# Altium integrated library Connectors.IntLib: 512 symbols (part 1 of 2) (continued)
## KE 04 1 1 x 1 xxxx G (continued)

## KE 06 1 1 x 1 xxxx G
designator X?  (value not drawn)
3.5 mm 300V/8A; Manufacturer PartNumber: jx-017; Value: WJ15EDGRHBN-THT-3.5; Note: Connector; Temp.Characteristic: -40C to +85C; Package / Case: 3.5 mm; PartNumber Digi-Key: jx-017; Publisher: Catcatcat Electronics; Voltage: 300V/8A; Manufacturer: http://en.china-wj.com/index.html; Website developer: http://catcatcat.d-lan.dp.ua/; Assembly type: Manual Part
footprint KE 06 1 1 x 1 xxxx G
pins: 1, 2, 3, 4, 5, 6

## KE 08 1 1 x 1 xxxx G
designator X?  (value not drawn)
3.5 mm 300V/8A; Manufacturer PartNumber: jx-017; Value: WJ15EDGRHBN-THT-3.5; Note: Connector; Temp.Characteristic: -40C to +85C; Package / Case: 3.5 mm; PartNumber Digi-Key: jx-017; Publisher: Catcatcat Electronics; Voltage: 300V/8A; Manufacturer: http://en.china-wj.com/index.html; Website developer: http://catcatcat.d-lan.dp.ua/; Assembly type: Manual Part
footprint KE 08 1 1 x 1 xxxx G
pins: 1, 2, 3, 4, 5, 6, 7, 8

## KE 10 1 1 x 1 xxxx G
designator X?  (value not drawn)
3.5 mm 300V/8A; Manufacturer PartNumber: jx-017; Value: WJ15EDGRHBN-THT-3.5; Note: Connector; Temp.Characteristic: -40C to +85C; Package / Case: 3.5 mm; PartNumber Digi-Key: jx-017; Publisher: Catcatcat Electronics; Voltage: 300V/8A; Manufacturer: http://en.china-wj.com/index.html; Website developer: http://catcatcat.d-lan.dp.ua/; Assembly type: Manual Part
footprint KE 10 1 1 x 1 xxxx G
pins: 1, 2, 3, 4, 5, 6, 7, 8, 9, 10

## KE 12 1 1 x 1 xxxx G
designator X?  (value not drawn)
3.5 mm 300V/8A; Manufacturer PartNumber: jx-017; Value: WJ15EDGRHBN-THT-3.5; Note: Connector; Temp.Characteristic: -40C to +85C; Package / Case: 3.5 mm; PartNumber Digi-Key: jx-017; Publisher: Catcatcat Electronics; Voltage: 300V/8A; Manufacturer: http://en.china-wj.com/index.html; Website developer: http://catcatcat.d-lan.dp.ua/; Assembly type: Manual Part
footprint KE 12 1 1 x 1 xxxx G
pins: 1, 2, 3, 4, 5, 6, 7, 8, 9, 10, 11, 12

## KE 14 1 1 x 1 xxxx G
designator X?  (value not drawn)
3.5 mm 300V/8A; Manufacturer PartNumber: jx-017; Value: WJ15EDGRHBN-THT-3.5; Note: Connector; Temp.Characteristic: -40C to +85C; Package / Case: 3.5 mm; PartNumber Digi-Key: jx-017; Publisher: Catcatcat Electronics; Voltage: 300V/8A; Manufacturer: http://en.china-wj.com/index.html; Website developer: http://catcatcat.d-lan.dp.ua/; Assembly type: Manual Part
footprint KE 14 1 1 x 1 xxxx G
pins: 1, 2, 3, 4, 5, 6, 7, 8, 9, 10, 11, 12, 13, 14

## KE 16 1 1 x 1 xxxx G
designator X?  (value not drawn)
3.5 mm 300V/8A; Manufacturer PartNumber: jx-017; Value: WJ15EDGRHBN-THT-3.5; Note: Connector; Temp.Characteristic: -40C to +85C; Package / Case: 3.5 mm; PartNumber Digi-Key: jx-017; Publisher: Catcatcat Electronics; Voltage: 300V/8A; Manufacturer: http://en.china-wj.com/index.html; Website developer: http://catcatcat.d-lan.dp.ua/; Assembly type: Manual Part
footprint KE 16 1 1 x 1 xxxx G
pins: 1, 2, 3, 4, 5, 6, 7, 8, 9, 10, 11, 12, 13, 14, 15, 16

## KE 18 1 1 x 1 xxxx G
designator X?  (value not drawn)
3.5 mm 300V/8A; Manufacturer PartNumber: jx-017; Value: WJ15EDGRHBN-THT-3.5; Note: Connector; Temp.Characteristic: -40C to +85C; Package / Case: 3.5 mm; PartNumber Digi-Key: jx-017; Publisher: Catcatcat Electronics; Voltage: 300V/8A; Manufacturer: http://en.china-wj.com/index.html; Website developer: http://catcatcat.d-lan.dp.ua/; Assembly type: Manual Part
footprint KE 18 1 1 x 1 xxxx G
pins: 1, 2, 3, 4, 5, 6, 7, 8, 9, 10, 11, 12, 13, 14, 15, 16, 17, 18

## KE 20 1 1 x 1 xxxx G
designator X?  (value not drawn)
3.5 mm 300V/8A; Manufacturer PartNumber: jx-017; Value: WJ15EDGRHBN-THT-3.5; Note: Connector; Temp.Characteristic: -40C to +85C; Package / Case: 3.5 mm; PartNumber Digi-Key: jx-017; Publisher: Catcatcat Electronics; Voltage: 300V/8A; Manufacturer: http://en.china-wj.com/index.html; Website developer: http://catcatcat.d-lan.dp.ua/; Assembly type: Manual Part
footprint KE 20 1 1 x 1 xxxx G
pins: 1, 2, 3, 4, 5, 6, 7, 8, 9, 10, 11, 12, 13, 14, 15, 16, 17, 18, 19, 20

## KE 22 1 1 x 1 xxxx G
designator X?  (value not drawn)
3.5 mm 300V/8A; Manufacturer PartNumber: jx-017; Value: WJ15EDGRHBN-THT-3.5; Note: Connector; Temp.Characteristic: -40C to +85C; Package / Case: 3.5 mm; PartNumber Digi-Key: jx-017; Publisher: Catcatcat Electronics; Voltage: 300V/8A; Manufacturer: http://en.china-wj.com/index.html; Website developer: http://catcatcat.d-lan.dp.ua/; Assembly type: Manual Part
footprint KE 22 1 1 x 1 xxxx G
pins: 1, 2, 3, 4, 5, 6, 7, 8, 9, 10, 11, 12, 13, 14, 15, 16, 17, 18, 19, 20, 21, 22

## KE 24 1 1 x 1 xxxx G
designator X?  (value not drawn)
3.5 mm 300V/8A; Manufacturer PartNumber: jx-017; Value: WJ15EDGRHBN-THT-3.5; Note: Connector; Temp.Characteristic: -40C to +85C; Package / Case: 3.5 mm; PartNumber Digi-Key: jx-017; Publisher: Catcatcat Electronics; Voltage: 300V/8A; Manufacturer: http://en.china-wj.com/index.html; Website developer: http://catcatcat.d-lan.dp.ua/; Assembly type: Manual Part
footprint KE 24 1 1 x 1 xxxx G
pins: 1, 2, 3, 4, 5, 6, 7, 8, 9, 10, 11, 12, 13, 14, 15, 16, 17, 18, 19, 20, 21, 22, 23, 24

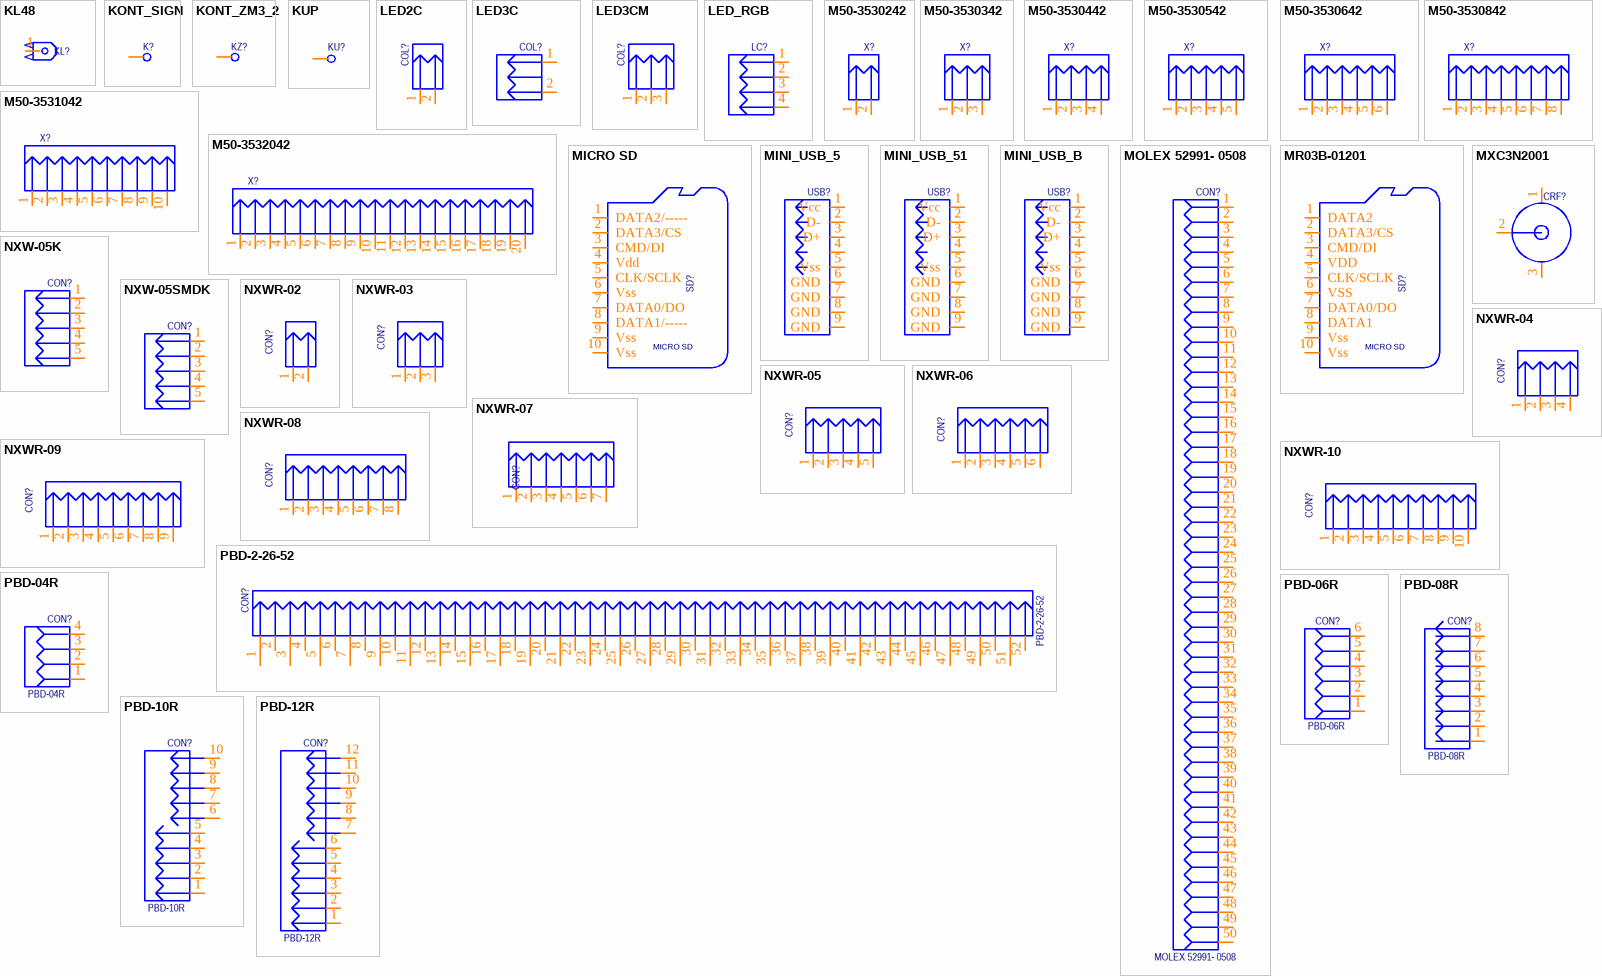
[diagram p4: symbols KL48 to PBD-12R]

## KL48
designator KL?  (value not drawn)
Note: Connector; Temp.Characteristic: -40C to +85C; Value: *; Publisher: Catcatcat Electronics; Website developer: http://catcatcat.d-lan.dp.ua/; Assembly type: Manual Part
footprint KL48
pins: 1, 2 hidden

## KONT_SIGN
designator K?  (value not drawn)
Note: Connector; Temp.Characteristic: -40C to +85C; Value: *; Publisher: Catcatcat Electronics; Website developer: http://catcatcat.d-lan.dp.ua/; Assembly type: Manual Part
footprint KONT_SIGN
pins: 1

## KONT_ZM3_2
designator KZ?  (value not drawn)
Note: Connector; Temp.Characteristic: -40C to +85C; Value: *; Publisher: Catcatcat Electronics; Website developer: http://catcatcat.d-lan.dp.ua/; Assembly type: Manual Part
footprint KONT_ZM3_2
pins: 1 0

## KUP
designator KU?  (value not drawn)
Note: Connector; Temp.Characteristic: -40C to +85C; Value: *; Publisher: Catcatcat Electronics; Website developer: http://catcatcat.d-lan.dp.ua/; Assembly type: Manual Part
footprint KUP
pins: 0

## LED2C
designator COL?  (value not drawn)
Note: Connector; Temp.Characteristic: -40C to +85C; Value: *; Publisher: Catcatcat Electronics; Website developer: http://catcatcat.d-lan.dp.ua/; Assembly type: Manual Part
footprint LED2C
pins: 1, 2

## LED3C
designator COL?  (value not drawn)
Note: Connector; Temp.Characteristic: -40C to +85C; Value: *; Publisher: Catcatcat Electronics; Website developer: http://catcatcat.d-lan.dp.ua/; Assembly type: Manual Part
footprint LED3C
pins: 1, 2, 3 hidden

## LED3CM
designator COL?  (value not drawn)
Note: Connector; Temp.Characteristic: -40C to +85C; Value: *; Publisher: Catcatcat Electronics; Website developer: http://catcatcat.d-lan.dp.ua/; Assembly type: Manual Part
footprint LED3CM
pins: 1, 2, 3

## LED_RGB
designator LC?  (value not drawn)
Note: Connector; Temp.Characteristic: -40C to +85C; Value: *; Publisher: Catcatcat Electronics; Website developer: http://catcatcat.d-lan.dp.ua/; Assembly type: Manual Part
footprint LED_RGB
pins: 1, 2, 3, 4

## M50-3530242
designator X?  (value not drawn)
CONN HDR 1.27MM T/H AU 2POS; Manufacturer: Harwin Inc.; Manufacturer PartNumber: M50-3530242; Note: Connector; Temp.Characteristic: -40C to +85C; Package / Case: 1.27mm; PartNumber Digi-Key: M50-3530242; Publisher: Catcatcat Electronics; HelpURL: https://cdn.harwin.com/pdfs/M50-353.pdf; Website developer: http://catcatcat.d-lan.dp.ua/; Assembly type: Manual Part
footprint M50-3530242 (1.27 mm)
pins: 1, 2

## M50-3530342
designator X?  (value not drawn)
CONN HDR 1.27MM T/H AU 3POS; Manufacturer: Harwin Inc.; Manufacturer PartNumber: M50-3530342; Note: Connector; Temp.Characteristic: -40C to +85C; Package / Case: 1.27mm; PartNumber Digi-Key: M50-3530342; Publisher: Catcatcat Electronics; HelpURL: https://cdn.harwin.com/pdfs/M50-353.pdf; Website developer: http://catcatcat.d-lan.dp.ua/; Assembly type: Manual Part
footprint M50-3530342 (1.27 mm)
pins: 1, 2, 3

## M50-3530442
designator X?  (value not drawn)
CONN HDR 1.27MM T/H AU 4POS; Manufacturer: Harwin Inc.; Manufacturer PartNumber: M50-3530442; Note: Connector; Temp.Characteristic: -40C to +85C; Package / Case: 1.27mm; PartNumber Digi-Key: M50-3530442; Publisher: Catcatcat Electronics; HelpURL: https://cdn.harwin.com/pdfs/M50-353.pdf; Website developer: http://catcatcat.d-lan.dp.ua/; Assembly type: Manual Part
footprint M50-3530442 (1.27 mm)
pins: 1, 2, 3, 4

## M50-3530542
designator X?  (value not drawn)
CONN HDR 1.27MM T/H AU 5POS; Manufacturer: Harwin Inc.; Manufacturer PartNumber: M50-3530542; Note: Connector; Temp.Characteristic: -40C to +85C; Package / Case: 1.27mm; PartNumber Digi-Key: M50-3530542; Publisher: Catcatcat Electronics; HelpURL: https://cdn.harwin.com/pdfs/M50-353.pdf; Website developer: http://catcatcat.d-lan.dp.ua/; Assembly type: Manual Part
footprint M50-3530542 (1.27 mm)
pins: 1, 2, 3, 4, 5

## M50-3530642
designator X?  (value not drawn)
CONN HDR 1.27MM T/H AU 6POS; Manufacturer: Harwin Inc.; Manufacturer PartNumber: M50-3530642; Note: Connector; Temp.Characteristic: -40C to +85C; Package / Case: 1.27mm; PartNumber Digi-Key: M50-3530642; Publisher: Catcatcat Electronics; HelpURL: https://cdn.harwin.com/pdfs/M50-353.pdf; Website developer: http://catcatcat.d-lan.dp.ua/; Assembly type: Manual Part
footprint M50-3530642 (1.27 mm)
pins: 1, 2, 3, 4, 5, 6

## M50-3530842
designator X?  (value not drawn)
CONN HDR 1.27MM T/H AU 8POS; Manufacturer: Harwin Inc.; Manufacturer PartNumber: M50-3530842; Note: Connector; Temp.Characteristic: -40C to +85C; Package / Case: 1.27mm; PartNumber Digi-Key: M50-3530842; Publisher: Catcatcat Electronics; HelpURL: https://cdn.harwin.com/pdfs/M50-353.pdf; Website developer: http://catcatcat.d-lan.dp.ua/; Assembly type: Manual Part
footprint M50-3530842 (1.27 mm)
pins: 1, 2, 3, 4, 5, 6, 7, 8

## M50-3531042
designator X?  (value not drawn)
CONN HDR 1.27MM T/H AU 10POS; Manufacturer: Harwin Inc.; Manufacturer PartNumber: M50-3531042; Note: Connector; Temp.Characteristic: -40C to +85C; Package / Case: 1.27mm; PartNumber Digi-Key: M50-3531042; Publisher: Catcatcat Electronics; HelpURL: https://cdn.harwin.com/pdfs/M50-353.pdf; Website developer: http://catcatcat.d-lan.dp.ua/; Assembly type: Manual Part
footprint M50-3531042 (1.27 mm)
pins: 1, 2, 3, 4, 5, 6, 7, 8, 9, 10

## M50-3532042
designator X?  (value not drawn)
CONN HDR 1.27MM T/H AU 10POS; Manufacturer: Harwin Inc.; Manufacturer PartNumber: M50-3532042; Note: Connector; Temp.Characteristic: -40C to +85C; Package / Case: 1.27mm; PartNumber Digi-Key: M50-3532042; Publisher: Catcatcat Electronics; HelpURL: https://cdn.harwin.com/pdfs/M50-353.pdf; Website developer: http://catcatcat.d-lan.dp.ua/; Assembly type: Manual Part
footprint M50-3532042 (1.27 mm)
pins: 1, 2, 3, 4, 5, 6, 7, 8, 9, 10, 11, 12, 13, 14, 15, 16, 17, 18, 19, 20

## MICRO SD
designator SD?  (value not drawn)
Micro SD; Note: Connector; Temp.Characteristic: -40C to +85C; Value: *; Publisher: Catcatcat Electronics; Website developer: http://catcatcat.d-lan.dp.ua/; Assembly type: Manual Part
footprint 5190008-010-R
pins: 1 DATA2/-----, 2 DATA3/CS, 3 CMD/DI, 4 Vdd, 5 CLK/SCLK, 6 Vss, 7 DATA0/DO, 8 DATA1/-----, 9 Vss, 10 Vss

## MINI_USB_5
designator USB?  (value not drawn)
Note: Connector; Temp.Characteristic: -40C to +85C; Value: *; Publisher: Catcatcat Electronics; Website developer: http://catcatcat.d-lan.dp.ua/; Assembly type: Manual Part
footprint MINI_USB_5
pins: 1 Vcc, 2 D-, 3 D+, 4, 5 Vss, 6 GND, 7 GND, 8 GND, 9 GND, 10 hidden, 11 hidden

## MINI_USB_51
designator USB?  (value not drawn)
Note: Connector; Temp.Characteristic: -40C to +85C; Value: *; Publisher: Catcatcat Electronics; Website developer: http://catcatcat.d-lan.dp.ua/; Assembly type: Manual Part
footprint MINI_USB_51
pins: 1 Vcc, 2 D-, 3 D+, 4, 5 Vss, 6 GND, 7 GND, 8 GND, 9 GND, 10 hidden, 11 hidden

## MINI_USB_B
designator USB?  (value not drawn)
Note: Connector; Temp.Characteristic: -40C to +85C; Value: *; Publisher: Catcatcat Electronics; Website developer: http://catcatcat.d-lan.dp.ua/; Assembly type: Manual Part
footprint MINI_USB_B
pins: 1 Vcc, 2 D-, 3 D+, 4, 5 Vss, 6 GND, 7 GND, 8 GND, 9 GND

## MOLEX 52991- 0508
designator CON?
Note: Connector; Temp.Characteristic: -40C to +85C; Value: *; Publisher: Catcatcat Electronics; Website developer: http://catcatcat.d-lan.dp.ua/; Assembly type: Manual Part
footprint MOLEX 52991- 0508
pins: 1, 2, 3, 4, 5, 6, 7, 8, 9, 10, 11, 12, 13, 14, 15, 16, 17, 18, 19, 20, 21, 22, 23, 24, 25, 26, 27, 28, 29, 30, 31, 32, 33, 34, 35, 36, 37, 38, 39, 40, 41, 42, 43, 44, 45, 46, 47, 48, 49, 50

## MR03B-01201
designator SD?  (value not drawn)
Micro SD; Note: Connector; Temp.Characteristic: -40C to +85C; Value: *; Publisher: Catcatcat Electronics; Website developer: http://catcatcat.d-lan.dp.ua/; Assembly type: Manual Part
footprint 5190008-010-R
pins: 1 DATA2, 2 DATA3/CS, 3 CMD/DI, 4 VDD, 5 CLK/SCLK, 6 VSS, 7 DATA0/DO, 8 DATA1, 9 Vss, 10 Vss
text: MICRO SD

## MXC3N2001
designator CRF?  (value not drawn)
Note: Connector; Temp.Characteristic: -40C to +85C; Publisher: Catcatcat Electronics; Website developer: http://catcatcat.d-lan.dp.ua/; Assembly type: Manual Part
footprint MXC3N2001
pins: 1 GND, 2 RF, 3 GND

## NXW-05K
designator CON?  (value not drawn)
Note: Connector; Temp.Characteristic: -40C to +85C; Value: *; Publisher: Catcatcat Electronics; Website developer: http://catcatcat.d-lan.dp.ua/; Assembly type: Manual Part
footprint NXW-05K
pins: 1, 2, 3, 4, 5

## NXW-05SMDK
designator CON?  (value not drawn)
Note: Connector; Temp.Characteristic: -40C to +85C; Value: *; Publisher: Catcatcat Electronics; Website developer: http://catcatcat.d-lan.dp.ua/; Assembly type: Manual Part
footprint NXW-05SMDK
pins: 1, 2, 3, 4, 5, 6 hidden, 7 hidden

## NXWR-02
designator CON?  (value not drawn)
PH-2AW; Note: Connector; Temp.Characteristic: -40C to +85C; Value: *; Publisher: Catcatcat Electronics; Website developer: http://catcatcat.d-lan.dp.ua/; Assembly type: Manual Part
footprint NXWR-02
pins: 1, 2

## NXWR-03
designator CON?  (value not drawn)
Note: Connector; Temp.Characteristic: -40C to +85C; Value: *; Publisher: Catcatcat Electronics; Website developer: http://catcatcat.d-lan.dp.ua/; Assembly type: Manual Part
footprint NXWR-03
pins: 1, 2, 3

## NXWR-04
designator CON?  (value not drawn)
Note: Connector; Temp.Characteristic: -40C to +85C; Value: *; Publisher: Catcatcat Electronics; Website developer: http://catcatcat.d-lan.dp.ua/; Assembly type: Manual Part
footprint NXWR-04
pins: 1, 2, 3, 4

## NXWR-05
designator CON?  (value not drawn)
Note: Connector; Temp.Characteristic: -40C to +85C; Value: *; Publisher: Catcatcat Electronics; Website developer: http://catcatcat.d-lan.dp.ua/; Assembly type: Manual Part
footprint NXWR-05
pins: 1, 2, 3, 4, 5

## NXWR-06
designator CON?  (value not drawn)
PH-6AW; Pricing Аlternative: 0.010; Note: Connector; Temp.Characteristic: -25C to +85C; Voltage: 100 V; Value: PH-6AW; ComponentLink1URL: http://www.jst-mfg.com/product/detail_e.php?series=199; ComponentLink2URL: http://www.jst-mfg.com/product/pdf/eng/ePH.pdf; Dealer Digi-Key: https://detail.1688.com/offer/550077379511.html; Dealer Аlternative: https://voron.ua/catalog/028519; Package / Case: NXWR-06; PartNumber Digi-Key: NXWR-06; Pricing Digi-Key: 0.0163; Publisher: Catcatcat Electronics; Website developer: http://catcatcat.d-lan.dp.ua/; Assembly type: Manual Part
footprint NXWR-06
pins: 1, 2, 3, 4, 5, 6

## NXWR-07
designator CON?  (value not drawn)
Note: Connector; Temp.Characteristic: -40C to +85C; Value: *; Publisher: Catcatcat Electronics; Website developer: http://catcatcat.d-lan.dp.ua/; Assembly type: Manual Part
footprint NXWR-07
pins: 1, 2, 3, 4, 5, 6, 7

## NXWR-08
designator CON?  (value not drawn)
Note: Connector; Temp.Characteristic: -40C to +85C; Value: *; Publisher: Catcatcat Electronics; Website developer: http://catcatcat.d-lan.dp.ua/; Assembly type: Manual Part
footprint NXWR-08
pins: 1, 2, 3, 4, 5, 6, 7, 8

## NXWR-09
designator CON?  (value not drawn)
Note: Connector; Temp.Characteristic: -40C to +85C; Value: *; Publisher: Catcatcat Electronics; Website developer: http://catcatcat.d-lan.dp.ua/; Assembly type: Manual Part
footprint NXWR-09
pins: 1, 2, 3, 4, 5, 6, 7, 8, 9

## NXWR-10
designator CON?  (value not drawn)
Note: Connector; Temp.Characteristic: -40C to +85C; Value: *; Publisher: Catcatcat Electronics; Website developer: http://catcatcat.d-lan.dp.ua/; Assembly type: Manual Part
footprint NXWR-10
pins: 1, 2, 3, 4, 5, 6, 7, 8, 9, 10

## PBD-2-26-52
designator CON?
Note: Connector; Temp.Characteristic: -40C to +85C; Value: *; Publisher: Catcatcat Electronics; Website developer: http://catcatcat.d-lan.dp.ua/; Assembly type: Manual Part
footprint PBD-2-26-52
pins: 1, 2, 3, 4, 5, 6, 7, 8, 9, 10, 11, 12, 13, 14, 15, 16, 17, 18, 19, 20, 21, 22, 23, 24, 25, 26, 27, 28, 29, 30, 31, 32, 33, 34, 35, 36, 37, 38, 39, 40, 41, 42, 43, 44, 45, 46, 47, 48, 49, 50, 51, 52

## PBD-04R
designator CON?
Note: Connector; Temp.Characteristic: -40C to +85C; Value: *; Publisher: Catcatcat Electronics; Website developer: http://catcatcat.d-lan.dp.ua/; Assembly type: Manual Part
footprint PBD-04R
pins: 1, 2, 3, 4

## PBD-06R
designator CON?
Note: Connector; Temp.Characteristic: -40C to +85C; Value: *; Publisher: Catcatcat Electronics; Website developer: http://catcatcat.d-lan.dp.ua/; Assembly type: Manual Part
footprint PBD-06R
pins: 1, 2, 3, 4, 5, 6

## PBD-08R
designator CON?
Note: Connector; Temp.Characteristic: -40C to +85C; Value: *; Publisher: Catcatcat Electronics; Website developer: http://catcatcat.d-lan.dp.ua/; Assembly type: Manual Part
footprint PBD-08R
pins: 1, 2, 3, 4, 5, 6, 7, 8

## PBD-10R
designator CON?
Note: Connector; Temp.Characteristic: -40C to +85C; Value: *; Publisher: Catcatcat Electronics; Website developer: http://catcatcat.d-lan.dp.ua/; Assembly type: Manual Part
footprint PBD-10R
pins: 1, 2, 3, 4, 5, 6, 7, 8, 9, 10

## PBD-12R
designator CON?
Note: Connector; Temp.Characteristic: -40C to +85C; Value: *; Publisher: Catcatcat Electronics; Website developer: http://catcatcat.d-lan.dp.ua/; Assembly type: Manual Part
footprint PBD-12R
pins: 1, 2, 3, 4, 5, 6, 7, 8, 9, 10, 11, 12

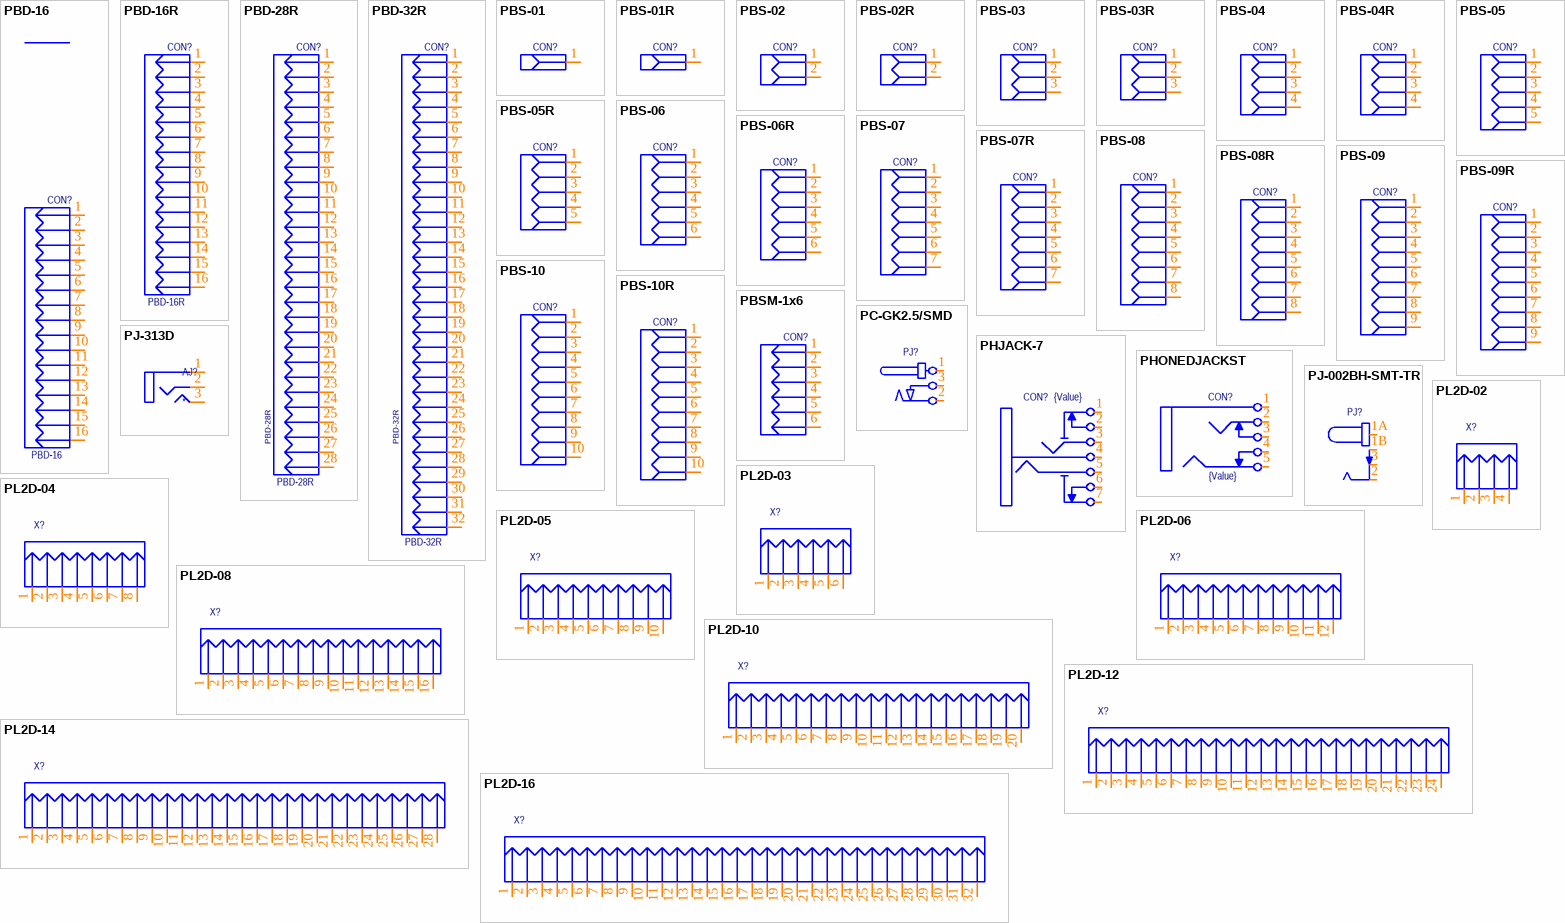
[diagram p5: symbols PBD-16 to PL2D-16]

## PBD-16
designator CON?
Note: Connector; Temp.Characteristic: -40C to +85C; Value: *; Publisher: Catcatcat Electronics; Website developer: http://catcatcat.d-lan.dp.ua/; Assembly type: Manual Part
footprint PBD-16
pins: 1, 2, 3, 4, 5, 6, 7, 8, 9, 10, 11, 12, 13, 14, 15, 16

## PBD-16R
designator CON?
Note: Connector; Temp.Characteristic: -40C to +85C; Value: *; Publisher: Catcatcat Electronics; Website developer: http://catcatcat.d-lan.dp.ua/; Assembly type: Manual Part
footprint PBD-16R
pins: 1, 2, 3, 4, 5, 6, 7, 8, 9, 10, 11, 12, 13, 14, 15, 16

## PBD-28R
designator CON?
Note: Connector; Temp.Characteristic: -40C to +85C; Value: *; Publisher: Catcatcat Electronics; Website developer: http://catcatcat.d-lan.dp.ua/; Assembly type: Manual Part
footprint PBD-28R
pins: 1, 2, 3, 4, 5, 6, 7, 8, 9, 10, 11, 12, 13, 14, 15, 16, 17, 18, 19, 20, 21, 22, 23, 24, 25, 26, 27, 28

## PBD-32R
designator CON?
Note: Connector; Temp.Characteristic: -40C to +85C; Value: *; Publisher: Catcatcat Electronics; Website developer: http://catcatcat.d-lan.dp.ua/; Assembly type: Manual Part
footprint PBD-32R
pins: 1, 2, 3, 4, 5, 6, 7, 8, 9, 10, 11, 12, 13, 14, 15, 16, 17, 18, 19, 20, 21, 22, 23, 24, 25, 26, 27, 28, 29, 30, 31, 32

## PBS-01
designator CON?  (value not drawn)
2.54mm; Note: Connector; Temp.Characteristic: -40C to +85C; Value: *; Publisher: Catcatcat Electronics; Website developer: http://catcatcat.d-lan.dp.ua/; Assembly type: Manual Part
footprint PBS-01
pins: 1

## PBS-01R
designator CON?  (value not drawn)
2.54mm; Note: Connector; Temp.Characteristic: -40C to +85C; Value: *; Publisher: Catcatcat Electronics; Website developer: http://catcatcat.d-lan.dp.ua/; Assembly type: Manual Part
footprint PBS-01R
pins: 1

## PBS-02
designator CON?  (value not drawn)
2.54mm; Note: Connector; Temp.Characteristic: -40C to +85C; Value: *; Publisher: Catcatcat Electronics; Website developer: http://catcatcat.d-lan.dp.ua/; Assembly type: Manual Part
footprint PBS-02
pins: 1, 2

## PBS-02R
designator CON?  (value not drawn)
2.54mm; Note: Connector; Temp.Characteristic: -40C to +85C; Value: *; Publisher: Catcatcat Electronics; Website developer: http://catcatcat.d-lan.dp.ua/; Assembly type: Manual Part
footprint PBS-02R
pins: 1, 2

## PBS-03
designator CON?  (value not drawn)
2.54mm; Note: Connector; Temp.Characteristic: -40C to +85C; Value: *; Publisher: Catcatcat Electronics; Website developer: http://catcatcat.d-lan.dp.ua/; Assembly type: Manual Part
footprint PBS-03
pins: 1, 2, 3

## PBS-03R
designator CON?  (value not drawn)
2.54mm; Note: Connector; Temp.Characteristic: -40C to +85C; Value: *; Publisher: Catcatcat Electronics; Website developer: http://catcatcat.d-lan.dp.ua/; Assembly type: Manual Part
footprint PBS-03R
pins: 1, 2, 3

## PBS-04
designator CON?  (value not drawn)
2.54mm; Note: Connector; Temp.Characteristic: -40C to +85C; Value: *; Publisher: Catcatcat Electronics; Website developer: http://catcatcat.d-lan.dp.ua/; Assembly type: Manual Part
footprint PBS-04
pins: 1, 2, 3, 4
